# Altium footprint library SparkFun.PCBLIB: 674 footprints (part 9 of 44)
Each footprint in its own frame and in the unit in brackets; x right, y up, seen from the top. Pads: shape width x height; smd on the part's side, far side on the other; paste and mask are expansions set on the pad; w line width, h text height; cw(c..) or ccw(c..) is an arc to the next point about the centre after c.
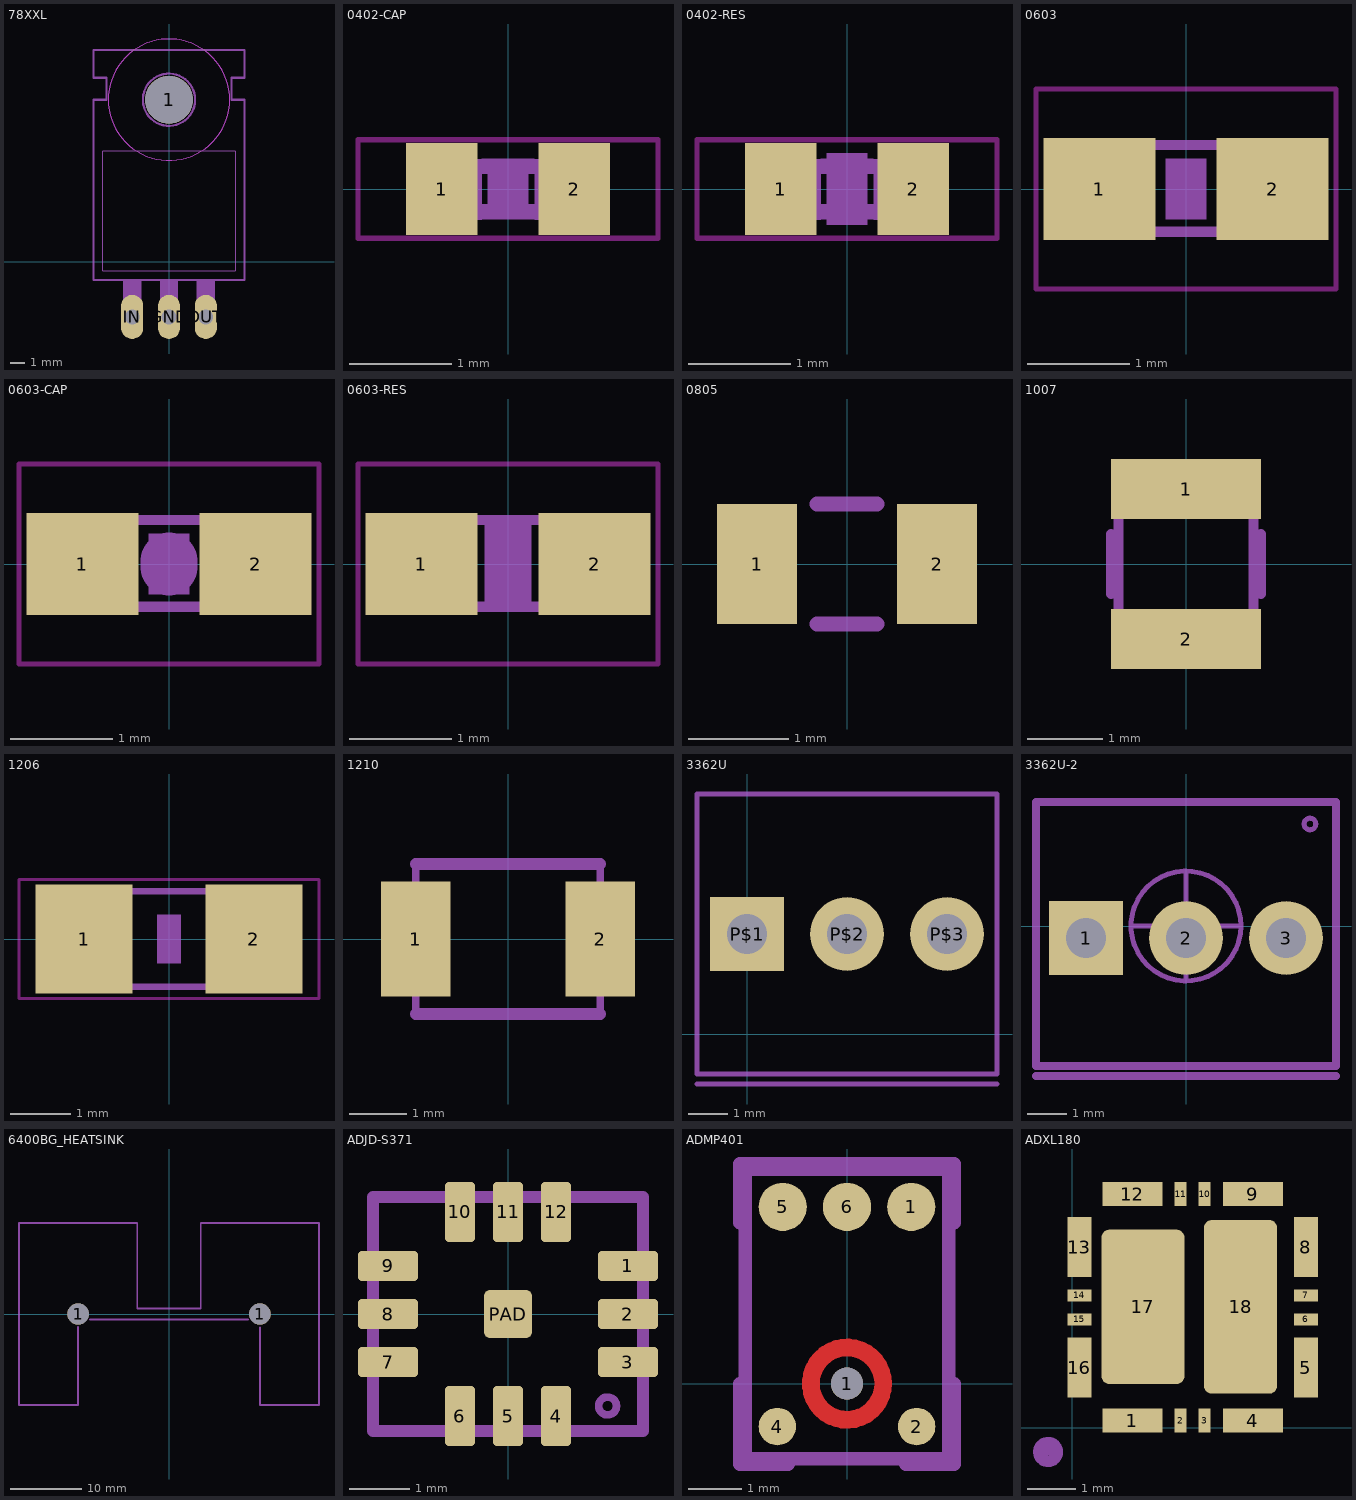
[diagram p8: the footprints below, top view; thin cyan lines are the x and y axes]

## 78XXL [mil]
pads (4):
  round 130 hole 130: 1(0,440)
  oval 60x120 hole 40: GND(0,-150) IN(-100,-150) OUT(100,-150)
Mechanical 2:
  circle w6: c0,440 r71
  rectangle: 75,-85 125,-50
  rectangle: -25,-85 25,-50
  rectangle: -125,-85 -75,-50
  lines w2: -180,-25 180,-25 180,300 -180,300 -180,-25
  lines w6: -205,-50 205,-50 205,440 170,440 170,500 205,500 205,575 -205,575 -205,500 -170,500 -170,440 -205,440 -205,-50
Mechanical 11 keep-out:
  circle w0: c0,440 r165
Mechanical 12:
  circle w0: c0,440 r165
Mechanical 18:
  rectangle: 75,-150 125,-85
  rectangle: -25,-150 25,-85
  rectangle: -125,-150 -75,-85

## 0402-CAP [mm]
pads (2):
  rect 0.7x0.9 smd: 1(-0.65,0) 2(0.65,0)
Keep-Out Layer:
  lines w0.051: -1.473,-0.483 1.473,-0.483 1.473,0.483 -1.473,0.483 -1.473,-0.483
Mechanical 2:
  lines w0.406: 0,-0.03 0,0.03
Mechanical 8:
  rectangle: -0.2,-0.3 0.2,0.3
Mechanical 18:
  rectangle: -0.554,-0.305 -0.254,0.295
  rectangle: 0.259,-0.305 0.559,0.295
  lines w0.152: -0.245,-0.224 0.245,-0.224 ; -0.245,0.224 0.245,0.224

## 0402-RES [mm]
pads (2):
  rect 0.7x0.9 smd: 1(-0.65,0) 2(0.65,0)
Keep-Out Layer:
  lines w0.051: -1.473,-0.483 1.473,-0.483 1.473,0.483 -1.473,0.483 -1.473,-0.483
Mechanical 2:
  rectangle: -0.203,-0.356 0.203,0.356
Mechanical 8:
  rectangle: -0.2,-0.3 0.2,0.3
Mechanical 18:
  rectangle: -0.554,-0.305 -0.254,0.295
  rectangle: 0.259,-0.305 0.559,0.295
  lines w0.152: -0.245,-0.224 0.245,-0.224 ; -0.245,0.224 0.245,0.224

## 0603 [mm]
pads (2):
  rect 1.1x1 smd: 1(-0.85,0) 2(0.85,0)
Keep-Out Layer:
  lines w0.051: -1.473,-0.983 1.473,-0.983 1.473,0.983 -1.473,0.983 -1.473,-0.983
Mechanical 8:
  rectangle: -0.2,-0.3 0.2,0.3
Mechanical 18:
  rectangle: -0.838,-0.47 -0.338,0.48
  rectangle: 0.33,-0.47 0.83,0.48
  lines w0.102: -0.356,-0.419 0.356,-0.419 ; -0.356,0.432 0.356,0.432

## 0603-CAP [mm]
pads (2):
  rect 1.1x1 smd: 1(-0.85,0) 2(0.85,0)
Keep-Out Layer:
  lines w0.051: -1.473,-0.983 1.473,-0.983 1.473,0.983 -1.473,0.983 -1.473,-0.983
Mechanical 2:
  lines w0.559: 0,-0.03 0,0.03
Mechanical 8:
  rectangle: -0.2,-0.3 0.2,0.3
Mechanical 18:
  rectangle: -0.838,-0.47 -0.338,0.48
  rectangle: 0.33,-0.47 0.83,0.48
  lines w0.102: -0.356,-0.419 0.356,-0.419 ; -0.356,0.432 0.356,0.432

## 0603-RES [mm]
pads (2):
  rect 1.1x1 smd: 1(-0.85,0) 2(0.85,0)
Keep-Out Layer:
  lines w0.051: -1.473,-0.983 1.473,-0.983 1.473,0.983 -1.473,0.983 -1.473,-0.983
Mechanical 2:
  rectangle: -0.229,-0.381 0.229,0.381
Mechanical 8:
  rectangle: -0.2,-0.3 0.2,0.3
Mechanical 18:
  rectangle: -0.838,-0.47 -0.338,0.48
  rectangle: 0.33,-0.47 0.83,0.48
  lines w0.102: -0.356,-0.419 0.356,-0.419 ; -0.356,0.432 0.356,0.432

## 0805 [mil]
pads (2):
  rect 31.5x47.24 smd: 1(-35.43,0) 2(35.43,0)
Mechanical 2:
  lines w6: -11.81,-23.62 11.81,-23.62 ; -11.81,23.62 11.81,23.62

## 1007 [mm]
pads (2):
  rect 2x0.8 smd: 1(0,1) 2(0,-1)
Mechanical 2:
  lines w0.127: -1,-0.4 -1,0.4 ; 1,-0.4 1,0.4
Mechanical 18:
  lines w0.127: -0.9,-1.25 -0.9,1.25 0.9,1.25 0.9,-1.25 -0.9,-1.25

## 1206 [mil]
pads (2):
  rect 62.99x70.87 smd: 1(-55.12,0) 2(55.12,0)
Keep-Out Layer:
  lines w2: -97.36,-38.7 97.36,-38.7 97.36,38.7 -97.36,38.7 -97.36,-38.7
Mechanical 8:
  rectangle: -7.87,-15.75 7.87,15.75
Mechanical 18:
  rectangle: -67,-33.5 -37.47,33.43
  rectangle: 37.47,-33.43 67,33.5
  lines w4: -37.99,-30.98 37.99,-30.98 ; -37.99,30.98 37.99,30.98

## 1210 [mm]
pads (2):
  rect 1.2x2 smd: 1(-1.6,0) 2(1.6,0)
Mechanical 2:
  lines w0.203: -1.6,-1.3 1.6,-1.3 ; -1.6,1.3 1.6,1.3
Mechanical 18:
  lines w0.127: -1.6,-1.3 1.6,-1.3 1.6,1.3 -1.6,1.3 -1.6,-1.3

## 3362U [mil]
pads (3):
  rect 74x74 hole 40: P$1(0,100)
  round 74 hole 40: P$2(100,100) P$3(200,100)
Mechanical 2:
  lines w5: -50,-50 250,-50 ; -50,-40 250,-40 250,240 -50,240 -50,-40

## 3362U-2 [mil]
pads (3):
  rect 74x74 hole 40: 1(-100,-12)
  round 74 hole 40: 2(0,-12) 3(100,-12)
Mechanical 2:
  lines w8: -150,-140 150,-140 150,124 -150,124 -150,-140
Mechanical 18:
  circle w5: c0,0 r55
  circle w5: c124,102 r5.83
  lines w5: -55,0 55,0 ; 0,-55 0,55
  lines w8: -150,-150 150,-150

## 6400BG_HEATSINK [mil]
pads (2):
  round 118 hole 118: 1(-500,0) 1(500,0)
Mechanical 18:
  lines w10: -500,-70 -500,-500 -825,-500 -825,500 -175,500 -175,31 175,31 175,500 825,500 825,-500 500,-500 500,-75 ; -435,-31 435,-31

## ADJD-S371 [mm]
pads (13):
  rrect25% 1x0.5 smd: 1(2,0.8) 2(2,0) 3(2,-0.8) 7(-2,-0.8) 8(-2,0) 9(-2,0.8)
  rrect25% 0.5x1 smd: 4(0.8,-1.7) 5(0,-1.7) 6(-0.8,-1.7) 10(-0.8,1.7) 11(0,1.7) 12(0.8,1.7)
  rrect25% 0.8x0.8 smd paste-0.4: PAD(0,0)
Top Paste:
  rectangle: -0.3,-0.3 0.3,0.3
Mechanical 2:
  circle w0.127: c1.659,-1.533 r0.149
  lines w0.203: -2.25,-1.42 -2.25,-1.95 -1.42,-1.95 ; -2.25,1.42 -2.25,1.95 -1.42,1.95 ; 1.4,1.95 2.25,1.95 2.25,1.42 ; 1.42,-1.95 2.25,-1.95 2.25,-1.42
Mechanical 18:
  lines w0.203: -2.25,-1.95 -2.25,1.95 2.25,1.95 2.25,-1.95 -2.25,-1.95

## ADMP401 [mil]
pads (6):
  round 23.62 hole 23.62: 1(0,0)
  rrect100% 35.43x35.43 smd: 1(47.24,129.92) 5(-47.24,129.92) 6(0,129.92)
  rrect100% 27.56x27.56 smd: 2(51.18,-31.5) 4(-51.18,-31.5)
Top Layer:
  circle w12.99: c0,0 r26.57
Top Paste:
  circle w12.99: c0,0 r26.57
Top Solder:
  circle w20.87: c0,0 r26.57
Mechanical 2:
  lines w10: -78.74,0 -78.74,-59.06 -43.31,-59.06 ; -78.74,118.11 -78.74,161.42 78.74,161.42 78.74,118.11 ; 43.31,-59.06 78.74,-59.06 78.74,0
Mechanical 18:
  lines w10: -74.8,-55.12 -74.8,157.48 74.8,157.48 74.8,-55.12 -74.8,-55.12

## ADXL180 [mm]
pads (18):
  rect 1.25x0.5 smd: 1(1.25,0.15) 4(3.75,0.15) 9(3.75,4.85) 12(1.25,4.85)
  rect 0.25x0.5 smd: 2(2.25,0.15) 3(2.75,0.15) 10(2.75,4.85) 11(2.25,4.85)
  rect 0.5x1.25 smd: 5(4.85,1.25) 8(4.85,3.75) 13(0.15,3.75) 16(0.15,1.25)
  rect 0.5x0.25 smd: 6(4.85,2.25) 7(4.85,2.75) 14(0.15,2.75) 15(0.15,2.25)
  rrect20% 1.73x3.21 smd paste-1.605: 17(1.47,2.51)
  rrect20% 1.52x3.6 smd paste-1.8: 18(3.495,2.51)
Top Paste:
  region: 0,0 0.254,0 0.254,0.254 0,0.254
  region: 0,0 0.254,0 0.254,0.254 0,0.254
Mechanical 2:
  circle w0.127: c-0.5,-0.5 r0.25
  lines w0.127: -0.65,-0.55 -0.6,-0.375 -0.425,-0.375 -0.35,-0.475 -0.4,-0.6 -0.5,-0.65 -0.6,-0.6 -0.5,-0.475 -0.45,-0.525